# Altium footprint library Eceborg_Microchip.PcbLib: 9 footprints
Each footprint in its own frame and in the unit in brackets; x right, y up, seen from the top. Pads: shape width x height; smd on the part's side, far side on the other; paste and mask are expansions set on the pad; w line width, h text height; cw(c..) or ccw(c..) is an arc to the next point about the centre after c.
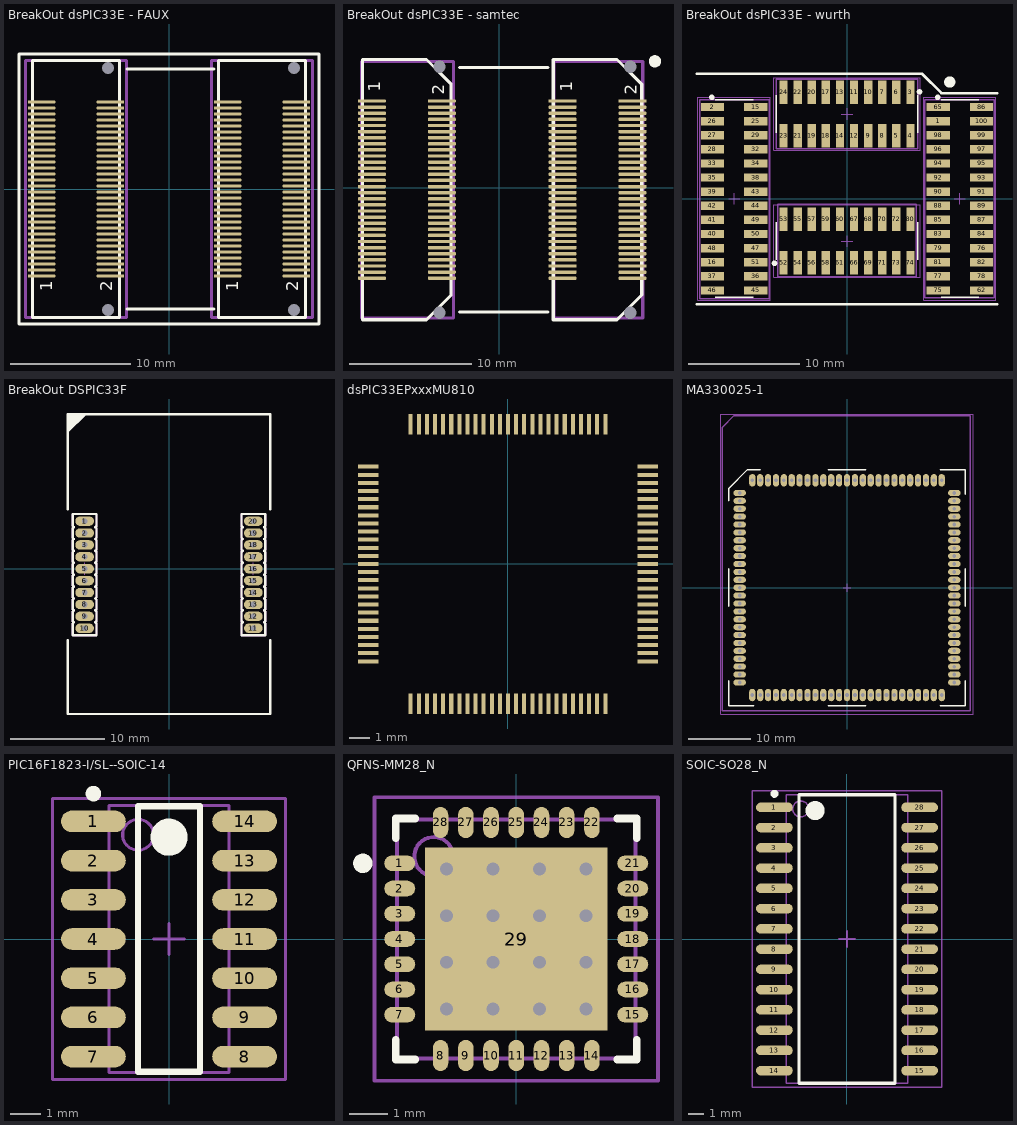
[diagram p0: the footprints below, top view; thin cyan lines are the x and y axes]

## BreakOut dsPIC33E - FAUX [mm] "breakOut 2015 pour dsPIC33E"
pads (124):
  rrect50% 2.273x0.279 smd: 1(-10.614,-7.251) 1(4.886,-7.251) 2(-4.886,-7.252) 2(10.614,-7.252) 3(-10.614,-6.751) 3(4.886,-6.751) 4(-4.886,-6.751) 4(10.614,-6.751) 5(-10.614,-6.251) 5(4.886,-6.251) 6(-4.886,-6.251) 6(10.614,-6.251) 7(-10.614,-5.751) 7(4.886,-5.751) 8(-4.886,-5.751) 8(10.614,-5.751) 9(-10.614,-5.251) 9(4.886,-5.251) 10(-4.886,-5.251) 10(10.614,-5.251) 11(-10.614,-4.751) 11(4.886,-4.751) 12(-4.886,-4.751) 12(10.614,-4.751) 13(-10.614,-4.251) 13(4.886,-4.251) 14(-4.886,-4.251) 14(10.614,-4.251) 15(-10.614,-3.751) 15(4.886,-3.751) 16(-4.886,-3.751) 16(10.614,-3.751) 17(-10.614,-3.251) 17(4.886,-3.251) 18(-4.886,-3.251) 18(10.614,-3.251) 19(-10.614,-2.751) 19(4.886,-2.751) 20(-4.886,-2.751) 20(10.614,-2.751) 21(-10.614,-2.25) 21(4.886,-2.25) 22(-4.886,-2.251) 22(10.614,-2.251) 23(-10.614,-1.75) 23(4.886,-1.75) 24(-4.886,-1.75) 24(10.614,-1.75) 25(-10.614,-1.25) 25(4.886,-1.25) 26(-4.886,-1.25) 26(10.614,-1.25) 27(-10.614,-0.75) 27(4.886,-0.75) 28(-4.886,-0.75) 28(10.614,-0.75) 29(-10.614,-0.25) 29(4.886,-0.25) 30(-4.886,-0.25) 30(10.614,-0.25) 31(-10.614,0.25) 31(4.886,0.25) 32(-4.886,0.25) 32(10.614,0.25) 33(-10.614,0.75) 33(4.886,0.75) 34(-4.886,0.75) 34(10.614,0.75) 35(-10.614,1.25) 35(4.886,1.25) 36(-4.886,1.25) 36(10.614,1.25) 37(-10.614,1.75) 37(4.886,1.75) 38(-4.886,1.75) 38(10.614,1.75) 39(-10.614,2.25) 39(4.886,2.25) 40(-4.886,2.25) 40(10.614,2.25) 41(-10.614,2.751) 41(4.886,2.751) 42(-4.886,2.75) 42(10.614,2.75) 43(-10.614,3.251) 43(4.886,3.251) 44(-4.886,3.251) 44(10.614,3.251) 45(-10.614,3.751) 45(4.886,3.751) 46(-4.886,3.751) 46(10.614,3.751) 47(-10.614,4.251) 47(4.886,4.251) 48(-4.886,4.251) 48(10.614,4.251) 49(-10.614,4.751) 49(4.886,4.751) 50(-4.886,4.751) 50(10.614,4.751) 51(-10.614,5.251) 51(4.886,5.251) 52(-4.886,5.251) 52(10.614,5.251) 53(-10.614,5.751) 53(4.886,5.751) 54(-4.886,5.751) 54(10.614,5.751) 55(-10.614,6.251) 55(4.886,6.251) 56(-4.886,6.251) 56(10.614,6.251) 57(-10.614,6.751) 57(4.886,6.751) 58(-4.886,6.751) 58(10.614,6.751) 59(-10.614,7.251) 59(4.886,7.251) 60(-4.886,7.251) 60(10.614,7.251)
  round 0 hole 1.016 unplated: 61(-5.084,-10.071) 61(10.416,-10.071) 62(-5.084,10.071) 62(10.416,10.071)
Top Overlay:
  lines w0.254: -3.5,-10 3.75,-10 ; -3.5,10 3.75,10 ; -12.5,-11.25 -12.5,11.25 12.5,11.25 12.5,-11.25 -12.25,-11.25 -12.5,-11.25 ; -11.37,-10.7 -11.37,10.7 -4.13,10.7 -4.13,-10.7 -11.37,-10.7 ; 4.13,-10.7 11.37,-10.7 11.37,10.7 4.13,10.7 4.13,-10.7
  text "1" at 5.75,-8.5 h1
  text "2" at 10.75,-8.5 h1
  text "2" at -4.75,-8.5 h1
  text "1" at -9.75,-8.5 h1
Mechanical 13:
  lines w0.254: -11.95,-10.7 -11.95,10.7 -3.55,10.7 -3.55,-10.7 -11.95,-10.7 ; 3.55,-10.7 11.95,-10.7 11.95,10.7 3.55,10.7 3.55,-10.7
Mechanical 17:
  text ".Designator" at 0.25,-5.5 h2
3D body: height 3.05, standoff -0.95, extent 4.003,-10.636 11.496,10.636
3D body: height 3.05, standoff -0.95, extent -11.497,-10.636 -4.004,10.636

## BreakOut dsPIC33E - samtec [mm] "breakOut 2015 pour dsPIC33E"
pads (124):
  rrect50% 2.273x0.279 smd: 1(10.914,7.1) 2(-10.414,7.1) 3(5.186,6.6) 4(5.186,6.1) 5(5.186,5.6) 6(5.186,5.1) 7(5.186,4.6) 8(5.186,4.1) 9(5.186,3.6) 10(5.186,3.1) 11(5.186,2.6) 12(5.186,2.1) 13(-4.686,4.1) 14(5.186,1.6) 15(-10.414,-7.4) 16(5.186,7.1) 17(-4.686,1.6) 18(-4.686,2.6) 19(-4.686,3.6) 20(-4.686,4.6) 21(-4.686,5.6) 22(-4.686,6.6) 23(-4.686,5.1) 24(-4.686,6.1) 25(-4.686,7.1) 26(-10.414,6.6) 27(-10.414,5.6) 28(-10.414,5.1) 29(-10.414,4.6) 32(-10.414,4.1) 33(-10.414,3.6) 34(-10.414,3.1) 35(-10.414,2.6) 36(-4.686,-7.4) 37(-4.686,1.1) 38(-10.414,2.1) 39(-10.414,1.6) 40(-10.414,1.1) 41(-10.414,0.6) 42(-10.414,0.1) 43(-10.414,-0.4) 44(-10.414,-0.9) 45(5.186,-7.4) 46(5.186,0.6) 47(-10.414,-1.4) 48(-10.414,-1.9) 49(-10.414,-2.4) 50(-10.414,-2.9) 51(-10.414,-5.4) 52(-10.414,-4.9) 53(-10.414,-4.4) 54(-10.414,-3.9) 55(-10.414,-5.9) 56(-10.414,-6.4) 57(-10.414,-6.9) 58(-4.686,-3.9) 59(-4.686,-3.4) 60(-4.686,-6.4) 61(-4.686,-6.9) 65(10.914,-7.4) 66(5.186,-6.9) 67(5.186,-6.4) 68(5.186,1.1) 69(5.186,0.1) 70(5.186,-0.9) 71(5.186,-1.9) 72(5.186,-2.9) 73(5.186,-3.9) 74(5.186,-5.9) 76(10.914,-4.4) 77(10.914,-4.9) 78(10.914,-3.9) 79(10.914,-3.4) 80(10.914,-2.9) 81(10.914,-2.4) 82(10.914,-1.9) 83(10.914,-1.4) 84(10.914,-0.9) 85(10.914,-0.4) 87(10.914,0.1) 88(10.914,0.6) 89(10.914,1.6) 90(10.914,1.1) 91(10.914,2.1) 92(10.914,2.6) 93(10.914,3.1) 94(10.914,3.6) 95(10.914,4.1) 96(10.914,4.6) 97(10.914,5.1) 98(10.914,5.6) 99(10.914,6.1) 100(10.914,6.6) 105(-10.414,6.1) 106(-10.414,-3.4) 107(-4.686,-5.9) 108(-4.686,-5.4) 109(-4.686,-4.9) 110(-4.686,-4.4) 111(-4.686,-2.9) 112(-4.686,-2.4) 113(-4.686,-1.9) 114(-4.686,-1.4) 115(-4.686,-0.9) 116(-4.686,-0.4) 117(-4.686,0.1) 118(-4.686,0.6) 120(-4.686,2.1) 121(-4.686,3.1) 122(5.186,-5.4) 123(5.186,-4.9) 124(5.186,-4.4) 125(5.186,-3.4) 126(5.186,-2.4) 127(5.186,-1.4) 128(5.186,-0.4) 130(10.914,-6.9) 131(10.914,-6.4) 132(10.914,-5.9) 133(10.914,-5.4)
  round 0 hole 1.016 unplated: 101(-4.884,-10.213) 102(-4.884,9.913) 103(10.716,-10.213) 104(10.716,9.913)
Top Overlay:
  circle w0.5: c12.75,10.35 r0.25
  lines w0.254: -3.25,-10.15 4,-10.15 ; -3.25,9.85 4,9.85 ; -11.17,-10.8 -5.95,-10.8 -3.93,-8.78 -3.93,8.48 -5.95,10.5 -11.17,10.5 -11.17,-10.8 ; 4.43,-10.8 4.43,10.5 9.65,10.5 11.67,8.48 11.67,-8.78 9.65,-10.8 4.43,-10.8
  text "2" at 11.25,7.6 h1
  text "1" at 6,7.85 h1
  text "1" at -9.75,7.85 h1
  text "2" at -4.5,7.6 h1
Mechanical 13:
  lines w0.254: -11.25,-10.65 -3.75,-10.65 -3.75,10.35 -11.25,10.35 -11.25,-10.65 ; 4.5,-10.65 4.5,10.35 11.75,10.35 11.75,-10.65 4.5,-10.65
Mechanical 17:
  text ".Designator" at 0.5,-5.65 h2
3D body: height 3.25, standoff -0.75, extent -11.296,-10.786 -3.803,10.486
3D body: height 3.25, standoff -0.75, extent 4.304,-10.786 11.797,10.486
3D body: height 10.2, standoff 0.79, extent -11.75,-10.4 12.25,10.101

## BreakOut dsPIC33E - wurth [mm] "breakOut 2015 pour dsPIC33E"
pads (96):
  rect 2.1x0.75 smd: 1(8.21,6.985) 2(-12.11,8.255) 15(-8.21,8.255) 16(-12.11,-5.715) 25(-8.21,6.985) 26(-12.11,6.985) 27(-12.11,5.715) 28(-12.11,4.445) 29(-8.21,5.715) 32(-8.21,4.445) 33(-12.11,3.175) 34(-8.21,3.175) 35(-12.11,1.905) 36(-8.21,-6.985) 37(-12.11,-6.985) 38(-8.21,1.905) 39(-12.11,0.635) 40(-12.11,-3.175) 41(-12.11,-1.905) 42(-12.11,-0.635) 43(-8.21,0.635) 44(-8.21,-0.635) 45(-8.21,-8.255) 46(-12.11,-8.255) 47(-8.21,-4.445) 48(-12.11,-4.445) 49(-8.21,-1.905) 50(-8.21,-3.175) 51(-8.21,-5.715) 62(12.11,-8.255) 65(8.21,8.255) 75(8.21,-8.255) 76(12.11,-4.445) 77(8.21,-6.985) 78(12.11,-6.985) 79(8.21,-4.445) 81(8.21,-5.715) 82(12.11,-5.715) 83(8.21,-3.175) 84(12.11,-3.175) 85(8.21,-1.905) 86(12.11,8.255) 87(12.11,-1.905) 88(8.21,-0.635) 89(12.11,-0.635) 90(8.21,0.635) 91(12.11,0.635) 92(8.21,1.905) 93(12.11,1.905) 94(8.21,3.175) 95(12.11,3.175) 96(8.21,4.445) 97(12.11,4.445) 98(8.21,5.715) 99(12.11,5.715) 100(12.11,6.985)
  rect 0.75x2.1 smd: 3(5.715,9.57) 4(5.715,5.67) 5(4.445,5.67) 6(4.445,9.57) 7(3.175,9.57) 8(3.175,5.67) 9(1.905,5.67) 10(1.905,9.57) 11(0.635,9.57) 12(0.635,5.67) 13(-0.635,9.57) 14(-0.635,5.67) 17(-1.905,9.57) 18(-1.905,5.67) 19(-3.175,5.67) 20(-3.175,9.57) 21(-4.445,5.67) 22(-4.445,9.57) 23(-5.715,5.67) 24(-5.715,9.57) 52(-5.715,-5.76) 53(-5.715,-1.86) 54(-4.445,-5.76) 55(-4.445,-1.86) 56(-3.175,-5.76) 57(-3.175,-1.86) 58(-1.905,-5.76) 59(-1.905,-1.86) 60(-0.635,-1.86) 61(-0.635,-5.76) 66(0.635,-5.76) 67(0.635,-1.86) 68(1.905,-1.86) 69(1.905,-5.76) 70(3.175,-1.86) 71(3.175,-5.76) 72(4.445,-1.86) 73(4.445,-5.76) 74(5.715,-5.76) 80(5.715,-1.86)
Top Overlay:
  circle w0.25: c6.525,9.62 r0.125
  circle w0.25: c-6.525,-5.81 r0.125
  circle w0.25: c-12.16,9.125 r0.125
  circle w0.25: c8.16,9.125 r0.125
  circle w0.5: c9.25,10.5 r0.25
  lines w0.127: -11.86,-8.89 -8.46,-8.89 ; -11.86,8.89 -8.46,8.89 ; -6.35,-5.51 -6.35,-2.11 ; -6.35,5.92 -6.35,9.32 ; 6.35,-5.51 6.35,-2.11 ; 6.35,5.92 6.35,9.32 ; 8.46,-8.89 11.86,-8.89 ; 8.46,8.89 11.86,8.89
  lines w0.254: -13.5,-9.5 13.5,-9.5 ; -13.5,11.25 6.75,11.25 8.5,9.5 13.5,9.5
Mechanical 13:
  lines w0.127: -13.25,-9 -7,-9 -7,8.89 -13.25,8.89 -13.25,-9 ; -6.35,4.5 6.35,4.5 6.35,10.75 -6.35,10.75 -6.35,4.5 ; -6.25,-7 -6.25,-0.5 6.25,-0.5 6.25,-7 -6.25,-7 ; 7,-8.89 7,8.89 13.25,8.89 13.25,-8.89 7,-8.89
Mechanical 15:
  lines w0.1: -10.66,0 -9.66,0 ; -10.16,-0.5 -10.16,0.5 ; -0.5,-3.81 0.5,-3.81 ; -0.5,7.62 0.5,7.62 ; 0,-4.31 0,-3.31 ; 0,7.12 0,8.12 ; 9.66,0 10.66,0 ; 10.16,-0.5 10.16,0.5 ; -13.41,-9.14 -6.91,-9.14 -6.91,9.14 -13.41,9.14 -13.41,-9.14 ; -6.6,-7.06 -6.6,-0.56 6.6,-0.56 6.6,-7.06 -6.6,-7.06 ; -6.6,4.37 -6.6,10.87 6.6,10.87 6.6,4.37 -6.6,4.37 ; 6.91,-9.14 6.91,9.14 13.41,9.14 13.41,-9.14 6.91,-9.14
Mechanical 17:
  text ".Designator" at -5.5,1.5 h2
3D body: height 5.88, standoff -0.02, extent -6.35,5.07 6.35,10.17
3D body: height 5.88, standoff -0.02, extent -6.35,-6.36 6.35,-1.26
3D body: height 5.88, standoff -0.02, extent -12.71,-8.89 -7.61,8.89
3D body: height 5.88, standoff -0.02, extent 7.61,-8.89 12.71,8.89
3D body: height 11.85, standoff 2.06, extent -13,-10.5 13.05,10.75

## BreakOut DSPIC33F [mm]
pads (20):
  oval 2x1 hole 0.6: 1(-9,5.08) 2(-9,3.81) 3(-9,2.54) 4(-9,1.27) 5(-9,0) 6(-9,-1.27) 7(-9,-2.54) 8(-9,-3.81) 9(-9,-5.08) 10(-9,-6.35) 11(9,-6.35) 12(9,-5.08) 13(9,-3.81) 14(9,-2.54) 15(9,-1.27) 16(9,0) 17(9,1.27) 18(9,2.54) 19(9,3.81) 20(9,5.08)
Top Overlay:
  region: -10.727,16.441 -8.832,16.441 -10.727,14.546
  lines w0.254: -10.795,-7.62 -10.795,-15.5 10.795,-15.5 10.795,-7.62 ; -10.795,6.35 -10.795,16.51 ; -10.795,16.5 10.795,16.5 10.795,6.35 ; -10.27,-7.112 -10.27,-5.842 -10.143,-5.715 -10.27,-5.588 -10.27,-4.572 -10.143,-4.445 -10.27,-4.318 -10.27,-3.302 -10.143,-3.175 -10.27,-3.048 -10.27,-2.032 -10.143,-1.905 -10.27,-1.778 -10.27,-0.762 -10.143,-0.635 -10.27,-0.508 -10.27,0.508 -10.143,0.635 -10.27,0.762 -10.27,1.778 -10.143,1.905 -10.27,2.032 -10.27,3.048 -10.143,3.175 -10.27,3.302 -10.27,4.318 -10.143,4.445 -10.27,4.572 -10.27,5.842 -7.73,5.842 -7.73,4.572 -7.857,4.445 -7.73,4.318 -7.73,3.302 -7.857,3.175 -7.73,3.048 -7.73,2.032 -7.857,1.905 -7.73,1.778 -7.73,0.762 -7.857,0.635 -7.73,0.508 -7.73,-0.508 -7.857,-0.635 -7.73,-0.762 -7.73,-1.778 -7.857,-1.905 -7.73,-2.032 -7.73,-3.048 -7.857,-3.175 -7.73,-3.302 -7.73,-4.318 -7.857,-4.445 -7.73,-4.572 -7.73,-5.588 -7.857,-5.715 -7.73,-5.842 -7.73,-7.112 -10.27,-7.112 ; 7.73,-7.112 10.27,-7.112 10.27,-5.842 10.143,-5.715 10.27,-5.588 10.27,-4.572 10.143,-4.445 10.27,-4.318 10.27,-3.302 10.143,-3.175 10.27,-3.048 10.27,-2.032 10.143,-1.905 10.27,-1.778 10.27,-0.762 10.143,-0.635 10.27,-0.508 10.27,0.508 10.143,0.635 10.27,0.762 10.27,1.778 10.143,1.905 10.27,2.032 10.27,3.048 10.143,3.175 10.27,3.302 10.27,4.318 10.143,4.445 10.27,4.572 10.27,5.842 7.73,5.842 7.73,4.572 7.857,4.445 7.73,4.318 7.73,3.302 7.857,3.175 7.73,3.048 7.73,2.032 7.857,1.905 7.73,1.778 7.73,0.762 7.857,0.635 7.73,0.508 7.73,-0.508 7.857,-0.635 7.73,-0.762 7.73,-1.778 7.857,-1.905 7.73,-2.032 7.73,-3.048 7.857,-3.175 7.73,-3.302 7.73,-4.318 7.857,-4.445 7.73,-4.572 7.73,-5.588 7.857,-5.715 7.73,-5.842 7.73,-7.112
Mechanical 13:
  lines w0.254: -10.27,-6.985 -10.27,-5.842 -10.143,-5.715 -10.27,-5.588 -10.27,-4.572 -10.143,-4.445 -10.27,-4.318 -10.27,-3.302 -10.143,-3.175 -10.27,-3.048 -10.27,-2.032 -10.143,-1.905 -10.27,-1.778 -10.27,-0.762 -10.143,-0.635 -10.27,-0.508 -10.27,0.508 -10.143,0.635 -10.27,0.762 -10.27,1.778 -10.143,1.905 -10.27,2.032 -10.27,3.048 -10.143,3.175 -10.27,3.302 -10.27,4.318 -10.143,4.445 -10.27,4.572 -10.27,5.715 -10.143,5.842 -7.857,5.842 -7.73,5.715 -7.73,4.572 -7.857,4.445 -7.73,4.318 -7.73,3.302 -7.857,3.175 -7.73,3.048 -7.73,2.032 -7.857,1.905 -7.73,1.778 -7.73,0.762 -7.857,0.635 -7.73,0.508 -7.73,-0.508 -7.857,-0.635 -7.73,-0.762 -7.73,-1.778 -7.857,-1.905 -7.73,-2.032 -7.73,-3.048 -7.857,-3.175 -7.73,-3.302 -7.73,-4.318 -7.857,-4.445 -7.73,-4.572 -7.73,-5.588 -7.857,-5.715 -7.73,-5.842 -7.73,-6.985 -7.857,-7.112 -10.143,-7.112 -10.27,-6.985 ; 7.73,-6.985 7.857,-7.112 10.143,-7.112 10.27,-6.985 10.27,-5.842 10.143,-5.715 10.27,-5.588 10.27,-4.572 10.143,-4.445 10.27,-4.318 10.27,-3.302 10.143,-3.175 10.27,-3.048 10.27,-2.032 10.143,-1.905 10.27,-1.778 10.27,-0.762 10.143,-0.635 10.27,-0.508 10.27,0.508 10.143,0.635 10.27,0.762 10.27,1.778 10.143,1.905 10.27,2.032 10.27,3.048 10.143,3.175 10.27,3.302 10.27,4.318 10.143,4.445 10.27,4.572 10.27,5.715 10.143,5.842 7.857,5.842 7.73,5.715 7.73,4.572 7.857,4.445 7.73,4.318 7.73,3.302 7.857,3.175 7.73,3.048 7.73,2.032 7.857,1.905 7.73,1.778 7.73,0.762 7.857,0.635 7.73,0.508 7.73,-0.508 7.857,-0.635 7.73,-0.762 7.73,-1.778 7.857,-1.905 7.73,-2.032 7.73,-3.048 7.857,-3.175 7.73,-3.302 7.73,-4.318 7.857,-4.445 7.73,-4.572 7.73,-5.588 7.857,-5.715 7.73,-5.842 7.73,-6.985
Mechanical 15:
  lines w0.127: -9,-0.635 -9,0.635 ; 9,-0.635 9,0.635 ; -10.27,-7.112 -10.27,5.842 -7.73,5.842 -7.73,-7.112 -10.27,-7.112 ; 7.73,-7.112 10.27,-7.112 10.27,5.842 7.73,5.842 7.73,-7.112
Mechanical 17:
  text ".Designator" at -5.842,1.524 h2
3D body: height 12, standoff 9, extent -10.795,-15.494 10.795,16.51
3D body: height 9, standoff 0, extent 7.73,-7.112 10.27,5.842
3D body: height 9, standoff 0, extent -10.27,-7.112 -7.73,5.842

## dsPIC33EPxxxMU810 [mm]
pads (100):
  rect 1x0.2 smd: 1(-6.9,4.8) 2(-6.9,4.4) 3(-6.9,4) 4(-6.9,3.6) 5(-6.9,3.2) 6(-6.9,2.8) 7(-6.9,2.4) 8(-6.9,2) 9(-6.9,1.6) 10(-6.9,1.2) 11(-6.9,0.8) 12(-6.9,0.4) 13(-6.9,0) 14(-6.9,-0.4) 15(-6.9,-0.8) 16(-6.9,-1.2) 17(-6.9,-1.6) 18(-6.9,-2) 19(-6.9,-2.4) 20(-6.9,-2.8) 21(-6.9,-3.2) 22(-6.9,-3.6) 23(-6.9,-4) 24(-6.9,-4.4) 25(-6.9,-4.8) 51(6.9,-4.8) 52(6.9,-4.4) 53(6.9,-4) 54(6.9,-3.6) 55(6.9,-3.2) 56(6.9,-2.8) 57(6.9,-2.4) 58(6.9,-2) 59(6.9,-1.6) 60(6.9,-1.2) 61(6.9,-0.8) 62(6.9,-0.4) 63(6.9,0) 64(6.9,0.4) 65(6.9,0.8) 66(6.9,1.2) 67(6.9,1.6) 68(6.9,2) 69(6.9,2.4) 70(6.9,2.8) 71(6.9,3.2) 72(6.9,3.6) 73(6.9,4) 74(6.9,4.4) 75(6.9,4.8)
  rect 0.2x1 smd: 26(-4.8,-6.9) 27(-4.4,-6.9) 28(-4,-6.9) 29(-3.6,-6.9) 30(-3.2,-6.9) 31(-2.8,-6.9) 32(-2.4,-6.9) 33(-2,-6.9) 34(-1.6,-6.9) 35(-1.2,-6.9) 36(-0.8,-6.9) 37(-0.4,-6.9) 38(0,-6.9) 39(0.4,-6.9) 40(0.8,-6.9) 41(1.2,-6.9) 42(1.6,-6.9) 43(2,-6.9) 44(2.4,-6.9) 45(2.8,-6.9) 46(3.2,-6.9) 47(3.6,-6.9) 48(4,-6.9) 49(4.4,-6.9) 50(4.8,-6.9) 76(4.8,6.9) 77(4.4,6.9) 78(4,6.9) 79(3.6,6.9) 80(3.2,6.9) 81(2.8,6.9) 82(2.4,6.9) 83(2,6.9) 84(1.6,6.9) 85(1.2,6.9) 86(0.8,6.9) 87(0.4,6.9) 88(0,6.9) 89(-0.4,6.9) 90(-0.8,6.9) 91(-1.2,6.9) 92(-1.6,6.9) 93(-2,6.9) 94(-2.4,6.9) 95(-2.8,6.9) 96(-3.2,6.9) 97(-3.6,6.9) 98(-4,6.9) 99(-4.4,6.9) 100(-4.8,6.9)
3D body: height 1.05, standoff -0.01, extent -7,-7 7,7

## MA330025-1 [mm] "Plug Microchip pour dsPIC33EP512MU8"
pads (100):
  oval 2x1 hole 0.6: 1(-17.272,15.24) 2(-17.272,13.97) 3(-17.272,12.7) 4(-17.272,11.43) 5(-17.272,10.16) 6(-17.272,8.89) 7(-17.272,7.62) 8(-17.272,6.35) 9(-17.272,5.08) 10(-17.272,3.81) 11(-17.272,2.54) 12(-17.272,1.27) 13(-17.272,0) 14(-17.272,-1.27) 15(-17.272,-2.54) 16(-17.272,-3.81) 17(-17.272,-5.08) 18(-17.272,-6.35) 19(-17.272,-7.62) 20(-17.272,-8.89) 21(-17.272,-10.16) 22(-17.272,-11.43) 23(-17.272,-12.7) 24(-17.272,-13.97) 25(-17.272,-15.24) 51(17.272,-15.24) 52(17.272,-13.97) 53(17.272,-12.7) 54(17.272,-11.43) 55(17.272,-10.16) 56(17.272,-8.89) 57(17.272,-7.62) 58(17.272,-6.35) 59(17.272,-5.08) 60(17.272,-3.81) 61(17.272,-2.54) 62(17.272,-1.27) 63(17.272,0) 64(17.272,1.27) 65(17.272,2.54) 66(17.272,3.81) 67(17.272,5.08) 68(17.272,6.35) 69(17.272,7.62) 70(17.272,8.89) 71(17.272,10.16) 72(17.272,11.43) 73(17.272,12.7) 74(17.272,13.97) 75(17.272,15.24)
  oval 1x2 hole 0.6: 26(-15.24,-17.272) 27(-13.97,-17.272) 28(-12.7,-17.272) 29(-11.43,-17.272) 30(-10.16,-17.272) 31(-8.89,-17.272) 32(-7.62,-17.272) 33(-6.35,-17.272) 34(-5.08,-17.272) 35(-3.81,-17.272) 36(-2.54,-17.272) 37(-1.27,-17.272) 38(0,-17.272) 39(1.27,-17.272) 40(2.54,-17.272) 41(3.81,-17.272) 42(5.08,-17.272) 43(6.35,-17.272) 44(7.62,-17.272) 45(8.89,-17.272) 46(10.16,-17.272) 47(11.43,-17.272) 48(12.7,-17.272) 49(13.97,-17.272) 50(15.24,-17.272) 76(15.24,17.272) 77(13.97,17.272) 78(12.7,17.272) 79(11.43,17.272) 80(10.16,17.272) 81(8.89,17.272) 82(7.62,17.272) 83(6.35,17.272) 84(5.08,17.272) 85(3.81,17.272) 86(2.54,17.272) 87(1.27,17.272) 88(0,17.272) 89(-1.27,17.272) 90(-2.54,17.272) 91(-3.81,17.272) 92(-5.08,17.272) 93(-6.35,17.272) 94(-7.62,17.272) 95(-8.89,17.272) 96(-10.16,17.272) 97(-11.43,17.272) 98(-12.7,17.272) 99(-13.97,17.272) 100(-15.24,17.272)
Top Overlay:
  lines w0.254: -19,-15 -19,-19 -15,-19 ; -19,-3 -19,3 ; -19,14 -19,16 -16,19 -14,19 ; -3,-19 3,-19 ; -3,19 3,19 ; 15,-19 19,-19 19,-15 ; 15,19 19,19 19,15 ; 19,-3 19,3
Mechanical 13:
  lines w0.254: -20.066,-19.812 -20.066,25.781 -18.161,27.686 19.812,27.686 19.812,-19.812 -20.066,-19.812
Mechanical 15:
  lines w0.127: -0.635,0 0.635,0 ; 0,-0.635 0,0.635 ; -20.32,-20.32 -20.32,27.94 20.32,27.94 20.32,-20.32 -20.32,-20.32
Mechanical 17:
  text ".Designator" at -5.715,1.905 h2
3D body: height 19.84, standoff 0, extent -20.066,-19.812 19.812,27.686

## PIC16F1823-I/SL--SOIC-14 [mm] "SOIC, 14-Leads, Body 8,6x3,9mm (max), Pitch 1,27mm, IPC Medium Density"
height 1.75
pads (14):
  oval 2.1x0.7 smd: 1(-2.45,3.81) 2(-2.45,2.54) 3(-2.45,1.27) 4(-2.45,0) 5(-2.45,-1.27) 6(-2.45,-2.54) 7(-2.45,-3.81) 8(2.45,-3.81) 9(2.45,-2.54) 10(2.45,-1.27) 11(2.45,0) 12(2.45,1.27) 13(2.45,2.54) 14(2.45,3.81)
Top Overlay:
  circle w0.25: c-2.45,4.71 r0.125
  circle w0.6: c0,3.3 r0.3
  lines w0.2: -1,-4.3 -1,4.3 1,4.3 1,-4.3 -1,-4.3
Mechanical 13:
  circle w0.1: c-1,3.375 r0.5
  lines w0.1: -1.95,-4.325 -1.95,4.325 1.95,4.325 1.95,-4.325 -1.95,-4.325
Mechanical 15:
  lines w0.1: -0.5,0 0.5,0 ; 0,-0.5 0,0.5 ; -3.775,-4.55 -3.775,4.55 3.775,4.55 3.775,-4.55 -3.775,-4.55
3D body: height 1.75, standoff 0.1, extent -1.95,-4.325 1.95,4.325

## QFNS-MM28_N [mm] "QFN, 28-Leads, Body 6x6 mm, Pitch 0.65mm, IPC Medium Density"
height 1
pads (29):
  oval 0.8x0.4 smd: 1(-3,1.95) 2(-3,1.3) 3(-3,0.65) 4(-3,0) 5(-3,-0.65) 6(-3,-1.3) 7(-3,-1.95) 15(3,-1.95) 16(3,-1.3) 17(3,-0.65) 18(3,0) 19(3,0.65) 20(3,1.3) 21(3,1.95)
  oval 0.4x0.8 smd: 8(-1.95,-3) 9(-1.3,-3) 10(-0.65,-3) 11(0,-3) 12(0.65,-3) 13(1.3,-3) 14(1.95,-3) 22(1.95,3) 23(1.3,3) 24(0.65,3) 25(0,3) 26(-0.65,3) 27(-1.3,3) 28(-1.95,3)
  rect 4.7x4.7 smd: 29(0,0)
via 1.8,-1.8 diameter 0.66 hole 0.33
via 0.6,-1.8 diameter 0.66 hole 0.33
via -0.6,-1.8 diameter 0.66 hole 0.33
via -1.8,-1.8 diameter 0.66 hole 0.33
via 1.8,-0.6 diameter 0.66 hole 0.33
via 0.6,-0.6 diameter 0.66 hole 0.33
via -0.6,-0.6 diameter 0.66 hole 0.33
via -1.8,-0.6 diameter 0.66 hole 0.33
via 1.8,0.6 diameter 0.66 hole 0.33
via 0.6,0.6 diameter 0.66 hole 0.33
via -0.6,0.6 diameter 0.66 hole 0.33
via -1.8,0.6 diameter 0.66 hole 0.33
via 1.8,1.8 diameter 0.66 hole 0.33
via 0.6,1.8 diameter 0.66 hole 0.33
via -0.6,1.8 diameter 0.66 hole 0.33
via -1.8,1.8 diameter 0.66 hole 0.33
Top Overlay:
  circle w0.25: c-3.95,1.95 r0.125
  lines w0.2: -3.1,-2.6 -3.1,-3.1 -2.6,-3.1 ; -3.1,2.6 -3.1,3.1 -2.6,3.1 ; 2.6,-3.1 3.1,-3.1 3.1,-2.6 ; 2.6,3.1 3.1,3.1 3.1,2.6
Mechanical 13:
  circle w0.1: c-2.125,2.125 r0.5
  lines w0.1: -3.075,-3.075 3.075,-3.075 3.075,3.075 -3.075,3.075 -3.075,-3.075
Mechanical 15:
  lines w0.1: -0.5,0 0.5,0 ; 0,-0.5 0,0.5 ; -3.65,-3.65 3.65,-3.65 3.65,3.65 -3.65,3.65 -3.65,-3.65
3D body: height 1, standoff 0, extent -3.075,-3.075 3.075,3.075

## SOIC-SO28_N [mm] "SOIC, 28-Leads, Body 17.9x7.5mm, Pitch 1.27mm, IPC Medium Density"
height 2.65
pads (28):
  oval 2.3x0.6 smd: 1(-4.55,8.255) 2(-4.55,6.985) 3(-4.55,5.715) 4(-4.55,4.445) 5(-4.55,3.175) 6(-4.55,1.905) 7(-4.55,0.635) 8(-4.55,-0.635) 9(-4.55,-1.905) 10(-4.55,-3.175) 11(-4.55,-4.445) 12(-4.55,-5.715) 13(-4.55,-6.985) 14(-4.55,-8.255) 15(4.55,-8.255) 16(4.55,-6.985) 17(4.55,-5.715) 18(4.55,-4.445) 19(4.55,-3.175) 20(4.55,-1.905) 21(4.55,-0.635) 22(4.55,0.635) 23(4.55,1.905) 24(4.55,3.175) 25(4.55,4.445) 26(4.55,5.715) 27(4.55,6.985) 28(4.55,8.255)
Top Overlay:
  circle w0.25: c-4.55,9.105 r0.125
  circle w0.6: c-2,8.05 r0.3
  lines w0.2: -3,-9.05 -3,9.05 3,9.05 3,-9.05 -3,-9.05
Mechanical 13:
  circle w0.1: c-2.9,8.155 r0.5
  lines w0.1: -3.8,-9.055 -3.8,9.055 3.8,9.055 3.8,-9.055 -3.8,-9.055
Mechanical 15:
  lines w0.1: -0.5,0 0.5,0 ; 0,-0.5 0,0.5 ; -5.95,-9.3 -5.95,9.3 5.95,9.3 5.95,-9.3 -5.95,-9.3
3D body: height 2.65, standoff 0, extent -3.8,-9.055 3.8,9.055